# Altium footprint library Transformers.PcbLib: 93 footprints (part 6 of 7)
Each footprint in its own frame and in the unit in brackets; x right, y up, seen from the top. Pads: shape width x height; smd on the part's side, far side on the other; paste and mask are expansions set on the pad; w line width, h text height; cw(c..) or ccw(c..) is an arc to the next point about the centre after c.
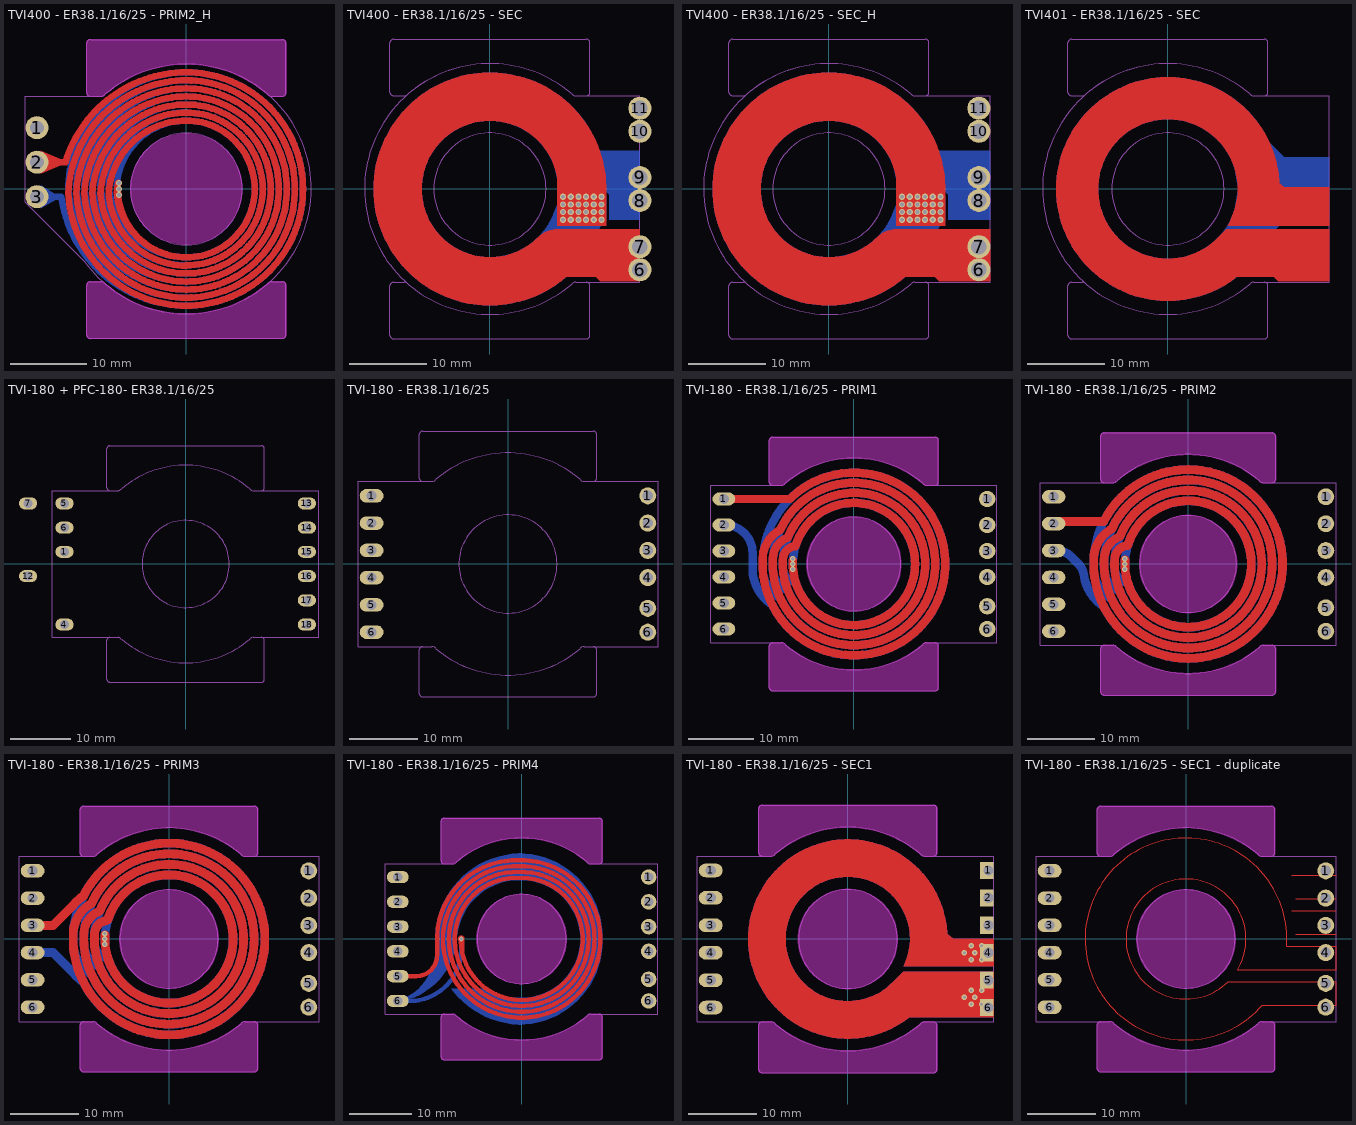
[diagram p5: the footprints below, top view; thin cyan lines are the x and y axes]

## TVI400 - ER38.1/16/25 - PRIM2_H [mm]
pads (3):
  round 3 hole 1.8: 1(-19.5,8) 2(-19.5,3.5) 3(-19.5,-1)
via -8.8,0 diameter 0.8 hole 0.5
via -8.8,-0.8 diameter 0.8 hole 0.5
via -8.8,0.8 diameter 0.8 hole 0.5
Top Layer:
  region: -19,5 -15.5,3.5 -19,2
  lines w0.85: -19.5,3.5 -15.789,3.5 -15.769,3.52 cw(c0,-1.25) 0,15.225 ; -10.152,-0.503 ccw(c0,0.175) 0,-10 cw(c0,0.175) -10.153,-0.494 ; -10.148,-0.507 cw(c0,-1.25) 0,8.925 ; -10.147,-0.497 cw(c0,-1.25) 0,8.925 ; -9.085,-0.401 cw(c0,-1.25) -8.892,0.798 ; -9.075,-0.498 ccw(c0,0.175) 0,-8.925 ; -8.911,-0.495 ccw(c0,0) 0,-8.925 ; 0,-15.225 ccw(c0,0) 15.225,0 ; 0,-15.225 cw(c0,0.2) -15.409,-0.496 ccw(c0,0.2) 0,-15.225 ; 0,-15.225 ccw(c0,0) 15.225,0 ; 0,-14.175 ccw(c0,0) 14.175,0 ; 0,-14.175 cw(c0,0.2) -14.358,-0.505 ccw(c0,0.2) 0,-14.175 ; 0,-14.175 ccw(c0,0) 14.175,0 ; 0,-13.125 ccw(c0,0) 13.125,0 ; 0,-13.125 cw(c0,0.2) -13.306,-0.503 ccw(c0,0.2) 0,-13.125 ; 0,-13.125 ccw(c0,0) 13.125,0 ; 0,-12.075 ccw(c0,0) 12.075,0 ; 0,-12.075 cw(c0,0.2) -12.255,-0.5 ccw(c0,0.2) 0,-12.075 ; 0,-12.075 ccw(c0,0) 12.075,0 ; 0,-11.025 ccw(c0,0) 11.025,0 ; 0,-11.025 cw(c0,0.2) -11.203,-0.497 ccw(c0,0.2) 0,-11.025 ; 0,-11.025 ccw(c0,0) 11.025,0 ; 0,-8.925 ccw(c0,0) 8.925,0 ; 0,-8.925 ccw(c0,0) 8.925,0 ; 0,8.925 cw(c0,0) 8.925,0 ; 0,8.925 cw(c0,0) 8.925,0 ; 0,9.975 cw(c0,0) 9.975,0 ; 0,9.975 ccw(c0,-1.25) -11.2,-0.503 cw(c0,-1.25) 0,9.975 ; 0,9.975 cw(c0,0) 9.975,0 ; 0,11.025 cw(c0,0) 11.025,0 ; 0,11.025 ccw(c0,-1.25) -12.252,-0.5 cw(c0,-1.25) 0,11.025 ; 0,11.025 cw(c0,0) 11.025,0 ; 0,12.075 cw(c0,0) 12.075,0 ; 0,12.075 ccw(c0,-1.25) -13.304,-0.497 cw(c0,-1.25) 0,12.075 ; 0,12.075 cw(c0,0) 12.075,0 ; 0,13.125 cw(c0,0) 13.125,0 ; 0,13.125 ccw(c0,-1.25) -14.355,-0.494 cw(c0,-1.25) 0,13.125 ; 0,13.125 cw(c0,0) 13.125,0 ; 0,14.175 cw(c0,0) 14.175,0 ; 0,14.175 ccw(c0,-1.25) -15.407,-0.505 cw(c0,-1.25) 0,14.175 ; 0,14.175 cw(c0,0) 14.175,0 ; 0,15.225 cw(c0,0) 15.225,0 ; 0,15.225 cw(c0,0) 15.225,0 ; 9.975,0 cw(c0,0) 0,-9.975 ccw(c0,0) 9.975,0
Bottom Layer:
  region: -19,0.5 -16.473,-1.059 -19,-2.5
  region: -9.3,0.4
  lines w0.85: -19.5,-1 -16.32,-1 ; -16.32,-1.001 ccw(c0,1.25) 0,-15.225 ccw(c0,0) 15.225,0 ccw(c0,0) 0,15.225 ccw(c0,-0.2) -15.409,0.496 ; -15.407,0.505 ccw(c0,1.25) 0,-14.175 ccw(c0,0) 14.175,0 ccw(c0,0) 0,14.175 ccw(c0,-0.2) -14.358,0.505 ; -14.355,0.494 ccw(c0,1.25) 0,-13.125 ccw(c0,0) 13.125,0 ccw(c0,0) 0,13.125 ccw(c0,-0.2) -13.306,0.503 ; -13.304,0.497 ccw(c0,1.25) 0,-12.075 ccw(c0,0) 12.075,0 ccw(c0,0) 0,12.075 ccw(c0,-0.2) -12.255,0.5 ; -12.252,0.5 ccw(c0,1.25) 0,-11.025 ccw(c0,0) 11.025,0 ccw(c0,0) 0,11.025 ccw(c0,-0.2) -11.203,0.497 ; -11.2,0.503 ccw(c0,1.25) 0,-9.975 ccw(c0,0) 9.975,0 ccw(c0,0) 0,9.975 ; -10.152,0.503 cw(c0,-0.175) 0,10 ; -10.147,0.497 ccw(c0,1.25) 0,-8.925 ccw(c0,0) 8.925,0 ccw(c0,0) 0,8.925 ccw(c0,-0.175) -9.075,0.498 ; -9.085,0.401 ccw(c0,1.25) -8.892,-0.798 ; -19,3.5 ccw(c-18.941,3.5) -18.941,3.441 cw(c-18.941,3.5) -19,3.5
Keep-Out Layer:
  drawing of 3 lines, arcs and shapes, not listed
Mechanical 2:
  circle w0.15: c0,0 r7.3
  lines w0.15: -0.251,-16.298 ccw(c0,0) 10.561,-12.416 ccw(c0,0) -0.251,16.298 ; 0.251,-16.298 cw(c0,0) -13.264,-9.474 -19.5,-3.238 -21,-1.738 -21,1 -21,12.103 -12.501,12.103 -11.15,12.103 ccw(c-11.15,12.771) -10.679,12.299 -10.562,12.416 cw(c0,0) 0.251,16.298
Top Assembly:
  circle w0.15: c0,0 r7.3
  lines w0.15: -0.251,16.298 cw(c0,0) 10.561,12.416 10.678,12.299 ccw(c11.15,12.771) 11.15,12.103 12.5,12.103 ccw(c12.5,12.603) 13,12.603 13,19 ccw(c12.5,19) 12.5,19.5 -12.5,19.5 ccw(c-12.5,19) -13,19 -13,12.603 ccw(c-12.5,12.603) -12.5,12.103 -11.15,12.103 ccw(c-11.15,12.771) -10.679,12.299 -10.562,12.416 cw(c0,0) 0.251,16.298 ; -13,-19 ccw(c-12.5,-19) -12.5,-19.5 ; -13,-19 ccw(c-12.5,-19) -12.5,-19.5 ; -13,-19 -13,-12.603 ; -13,-19 -13,-12.603 ; -13,-12.603 cw(c-12.5,-12.603) -12.5,-12.103 ; -13,-12.603 cw(c-12.5,-12.603) -12.5,-12.103 ; -12.5,-19.5 12.5,-19.5 ; -12.5,-19.5 12.5,-19.5 ; -12.5,-12.103 -11.15,-12.103 ; -12.5,-12.103 -11.15,-12.103 ; -11.15,-12.103 cw(c-11.15,-12.771) -10.679,-12.299 ; -11.15,-12.103 cw(c-11.15,-12.771) -10.679,-12.299 ; -10.679,-12.299 -10.562,-12.416 ; -10.679,-12.299 -10.562,-12.416 ; -10.561,-12.416 ccw(c0,0) 0.251,-16.298 cw(c0,0) -10.561,-12.416 ; 10.561,-12.416 cw(c0,0) -0.251,-16.298 ccw(c0,0) 10.561,-12.416 ; 10.561,-12.416 10.678,-12.299 ; 10.561,-12.416 10.678,-12.299 ; 10.678,-12.299 cw(c11.15,-12.771) 11.15,-12.103 ; 10.678,-12.299 cw(c11.15,-12.771) 11.15,-12.103 ; 11.15,-12.103 12.5,-12.103 ; 11.15,-12.103 12.5,-12.103 ; 12.5,-19.5 ccw(c12.5,-19) 13,-19 ; 12.5,-19.5 ccw(c12.5,-19) 13,-19 ; 12.5,-12.103 cw(c12.5,-12.603) 13,-12.603 ; 12.5,-12.103 cw(c12.5,-12.603) 13,-12.603 ; 13,-19 13,-12.603 ; 13,-19 13,-12.603
3D body "ER38.1-16-25.STEP": height 7.5, standoff -0.5, extent -12.7,-19.05 12.7,19.05

## TVI400 - ER38.1/16/25 - SEC [mm]
pads (6):
  round 3 hole 2: 6(19.5,-10.5) 7(19.5,-7.5) 8(19.5,-1.5) 9(19.5,1.5) 10(19.5,7.5) 11(19.5,10.5)
via 12.5,-4 diameter 0.8 hole 0.5
via 11.5,-4 diameter 0.8 hole 0.5
via 10.5,-4 diameter 0.8 hole 0.5
via 13.5,-3 diameter 0.8 hole 0.5
via 12.5,-3 diameter 0.8 hole 0.5
via 11.5,-3 diameter 0.8 hole 0.5
via 10.5,-3 diameter 0.8 hole 0.5
via 9.5,-3 diameter 0.8 hole 0.5
via 13.5,-2 diameter 0.8 hole 0.5
via 12.5,-2 diameter 0.8 hole 0.5
via 11.5,-2 diameter 0.8 hole 0.5
via 10.5,-2 diameter 0.8 hole 0.5
via 9.5,-2 diameter 0.8 hole 0.5
via 12.5,-1 diameter 0.8 hole 0.5
via 11.5,-1 diameter 0.8 hole 0.5
via 10.5,-1 diameter 0.8 hole 0.5
via 9.5,-1 diameter 0.8 hole 0.5
via 13.5,-1 diameter 0.8 hole 0.5
via 9.5,-4 diameter 0.8 hole 0.5
via 13.5,-4 diameter 0.8 hole 0.5
via 14.5,-4 diameter 0.8 hole 0.5
via 14.5,-1 diameter 0.8 hole 0.5
via 14.5,-2 diameter 0.8 hole 0.5
via 14.5,-3 diameter 0.8 hole 0.5
Top Layer:
  region: 6.107,-12 9.25,-12 9.825,-11.425 13.775,-11.425 14.35,-12 19.5,-12 19.5,-5.25 8.413,-5.25 3.885,-9.778
  region: 15.15,0.012 15.15,-4.75 8.75,-4.75 8.75,2.45 11.504,3.001
  lines w6.3: 8.546,-8.424 cw(c0,0) 0,-12 cw(c0,0) -12,0 cw(c0,0) 0,12 cw(c0,0) 11.903,-1.52
  text "1" at 14.5,7.5 h1.52
Bottom Layer:
  region: 9,0 14.75,0 15.5,-0.75 15.5,-4 19.5,-4 19.5,5 10,5 8.75,3.75 8.25,3.75 8.75,1.25 8.75,0
  region: 8.75,-0.275 14.525,-0.275 15.15,-0.9 15.15,-4.125 13.775,-5.5 8.75,-5.5 8.75,-2.5
  lines w6.3: 10.924,4.966 ccw(c0,0) 0,12 ccw(c0,0) -12,0 ccw(c0,0) 0,-12 ccw(c0,0) 11.398,-3.754
  text "2" at 15.5,7.5 h1.52
Mechanical 2:
  circle w0.15: c0,0 r7.3
  lines w0.15: -0.251,-16.298 ccw(c0,0) 10.562,-12.415 10.679,-12.299 cw(c11.15,-12.771) 11.15,-12.103 12.501,-12.103 19.5,-12.103 ; -0.251,16.298 cw(c0,0) 10.562,12.415 10.679,12.299 ccw(c11.15,12.771) 11.15,12.103 12.501,12.103 19.5,12.103 19.5,-0.5 19.5,-12.103 ; 0.251,-16.298 cw(c0,0) -10.561,-12.416 cw(c0,0) 0.251,16.298 ; 19.5,-3 19.5,-12.103
Top Assembly:
  circle w0.15: c0,0 r7.3
  lines w0.15: -0.251,16.298 cw(c0,0) 10.561,12.416 10.678,12.299 ccw(c11.15,12.771) 11.15,12.103 12.5,12.103 ccw(c12.5,12.603) 13,12.603 13,19 ccw(c12.5,19) 12.5,19.5 -12.5,19.5 ccw(c-12.5,19) -13,19 -13,12.603 ccw(c-12.5,12.603) -12.5,12.103 -11.15,12.103 ccw(c-11.15,12.771) -10.679,12.299 -10.562,12.416 cw(c0,0) 0.251,16.298 ; 11.15,-12.103 ccw(c11.15,-12.771) 10.678,-12.299 ; -13,-19 ccw(c-12.5,-19) -12.5,-19.5 ; -13,-19 ccw(c-12.5,-19) -12.5,-19.5 ; -13,-19 -13,-12.603 ; -13,-19 -13,-12.603 ; -13,-12.603 cw(c-12.5,-12.603) -12.5,-12.103 ; -13,-12.603 cw(c-12.5,-12.603) -12.5,-12.103 ; -12.5,-19.5 12.5,-19.5 ; -12.5,-19.5 12.5,-19.5 ; -12.5,-12.103 -11.15,-12.103 ; -12.5,-12.103 -11.15,-12.103 ; -11.15,-12.103 cw(c-11.15,-12.771) -10.679,-12.299 ; -11.15,-12.103 cw(c-11.15,-12.771) -10.679,-12.299 ; -10.679,-12.299 -10.562,-12.416 ; -10.679,-12.299 -10.562,-12.416 ; -10.561,-12.416 ccw(c0,0) 0.251,-16.298 cw(c0,0) -10.561,-12.416 ; 10.561,-12.416 cw(c0,0) -0.251,-16.298 ccw(c0,0) 10.561,-12.416 ; 10.561,-12.416 10.678,-12.299 ; 10.561,-12.416 10.678,-12.299 ; 10.561,-12.416 10.678,-12.299 ; 10.678,-12.299 cw(c11.15,-12.771) 11.15,-12.103 ; 10.678,-12.299 cw(c11.15,-12.771) 11.15,-12.103 ; 11.15,-12.103 12.5,-12.103 ; 11.15,-12.103 12.5,-12.103 ; 12.5,-19.5 ccw(c12.5,-19) 13,-19 ; 12.5,-19.5 ccw(c12.5,-19) 13,-19 ; 12.5,-12.103 cw(c12.5,-12.603) 13,-12.603 ; 12.5,-12.103 cw(c12.5,-12.603) 13,-12.603 ; 13,-19 13,-12.603 ; 13,-19 13,-12.603
3D body "ER38.1-16-25.STEP": height 7.5, standoff -0.5, extent -12.7,-19.05 12.7,19.05

## TVI400 - ER38.1/16/25 - SEC_H [mm]
pads (6):
  round 3 hole 2: 6(19.5,-10.5) 7(19.5,-7.5) 8(19.5,-1.5) 9(19.5,1.5) 10(19.5,7.5) 11(19.5,10.5)
via 14.5,-3 diameter 0.8 hole 0.5
via 14.5,-2 diameter 0.8 hole 0.5
via 14.5,-1 diameter 0.8 hole 0.5
via 14.5,-4 diameter 0.8 hole 0.5
via 13.5,-4 diameter 0.8 hole 0.5
via 9.5,-4 diameter 0.8 hole 0.5
via 13.5,-1 diameter 0.8 hole 0.5
via 9.5,-1 diameter 0.8 hole 0.5
via 10.5,-1 diameter 0.8 hole 0.5
via 11.5,-1 diameter 0.8 hole 0.5
via 12.5,-1 diameter 0.8 hole 0.5
via 9.5,-2 diameter 0.8 hole 0.5
via 10.5,-2 diameter 0.8 hole 0.5
via 11.5,-2 diameter 0.8 hole 0.5
via 12.5,-2 diameter 0.8 hole 0.5
via 13.5,-2 diameter 0.8 hole 0.5
via 9.5,-3 diameter 0.8 hole 0.5
via 10.5,-3 diameter 0.8 hole 0.5
via 11.5,-3 diameter 0.8 hole 0.5
via 12.5,-3 diameter 0.8 hole 0.5
via 13.5,-3 diameter 0.8 hole 0.5
via 10.5,-4 diameter 0.8 hole 0.5
via 11.5,-4 diameter 0.8 hole 0.5
via 12.5,-4 diameter 0.8 hole 0.5
Top Layer:
  region: 15.15,0.012 15.15,-4.75 8.75,-4.75 8.75,2.45 11.504,3.001
  region: 6.107,-12 9.25,-12 9.825,-11.425 13.775,-11.425 14.35,-12 21,-12 21,-5.25 8.413,-5.25 3.885,-9.778
  lines w6.3: 8.546,-8.424 cw(c0,0) 0,-12 cw(c0,0) -12,0 cw(c0,0) 0,12 cw(c0,0) 11.903,-1.52
Bottom Layer:
  region: 8.75,-0.275 14.525,-0.275 15.15,-0.9 15.15,-4.125 13.775,-5.5 8.75,-5.5 8.75,-2.5
  region: 9,0 14.75,0 15.5,-0.75 15.5,-4 21,-4 21,5 10,5 8.75,3.75 8.25,3.75 8.75,1.25 8.75,0
  lines w6.3: 10.924,4.966 ccw(c0,0) 0,12 ccw(c0,0) -12,0 ccw(c0,0) 0,-12 ccw(c0,0) 11.398,-3.754
Mechanical 2:
  circle w0.15: c0,0 r7.3
  lines w0.15: -0.251,-16.298 ccw(c0,0) 10.562,-12.415 10.679,-12.299 cw(c11.15,-12.771) 11.15,-12.103 12.501,-12.103 21,-12.103 21,1 21,12.103 12.501,12.103 11.15,12.103 cw(c11.15,12.771) 10.679,12.299 10.562,12.416 ccw(c0,0) -0.251,16.298 ; 0.251,-16.298 cw(c0,0) -10.561,-12.416 cw(c0,0) 0.251,16.298
Top Assembly:
  circle w0.15: c0,0 r7.3
  lines w0.15: -0.251,16.298 cw(c0,0) 10.561,12.416 10.678,12.299 ccw(c11.15,12.771) 11.15,12.103 12.5,12.103 ccw(c12.5,12.603) 13,12.603 13,19 ccw(c12.5,19) 12.5,19.5 -12.5,19.5 ccw(c-12.5,19) -13,19 -13,12.603 ccw(c-12.5,12.603) -12.5,12.103 -11.15,12.103 ccw(c-11.15,12.771) -10.679,12.299 -10.562,12.416 cw(c0,0) 0.251,16.298 ; 11.15,-12.103 ccw(c11.15,-12.771) 10.678,-12.299 ; -13,-19 ccw(c-12.5,-19) -12.5,-19.5 ; -13,-19 ccw(c-12.5,-19) -12.5,-19.5 ; -13,-19 -13,-12.603 ; -13,-19 -13,-12.603 ; -13,-12.603 cw(c-12.5,-12.603) -12.5,-12.103 ; -13,-12.603 cw(c-12.5,-12.603) -12.5,-12.103 ; -12.5,-19.5 12.5,-19.5 ; -12.5,-19.5 12.5,-19.5 ; -12.5,-12.103 -11.15,-12.103 ; -12.5,-12.103 -11.15,-12.103 ; -11.15,-12.103 cw(c-11.15,-12.771) -10.679,-12.299 ; -11.15,-12.103 cw(c-11.15,-12.771) -10.679,-12.299 ; -10.679,-12.299 -10.562,-12.416 ; -10.679,-12.299 -10.562,-12.416 ; -10.561,-12.416 ccw(c0,0) 0.251,-16.298 cw(c0,0) -10.561,-12.416 ; 10.561,-12.416 cw(c0,0) -0.251,-16.298 ccw(c0,0) 10.561,-12.416 ; 10.561,-12.416 10.678,-12.299 ; 10.561,-12.416 10.678,-12.299 ; 10.561,-12.416 10.678,-12.299 ; 10.678,-12.299 cw(c11.15,-12.771) 11.15,-12.103 ; 10.678,-12.299 cw(c11.15,-12.771) 11.15,-12.103 ; 11.15,-12.103 12.5,-12.103 ; 11.15,-12.103 12.5,-12.103 ; 12.5,-19.5 ccw(c12.5,-19) 13,-19 ; 12.5,-19.5 ccw(c12.5,-19) 13,-19 ; 12.5,-12.103 cw(c12.5,-12.603) 13,-12.603 ; 12.5,-12.103 cw(c12.5,-12.603) 13,-12.603 ; 13,-19 13,-12.603 ; 13,-19 13,-12.603
3D body "ER38.1-16-25.STEP": height 7.5, standoff -0.5, extent -12.7,-19.05 12.7,19.05

## TVI401 - ER38.1/16/25 - SEC [mm]
Top Layer:
  region: 15.1,0.226 21,0.226 21,-4.748 15.1,-4.748 7.808,-4.748 8.017,-4.333 8.384,-3.481 8.679,-2.601 8.9,-1.7 9.046,-0.784 9.117,0.142 9.111,1.069 9.028,1.994 8.958,2.452 11.712,3.003
  region: 5.532,-11.425 9.825,-11.425 13.775,-11.425 14.35,-12 21,-12 21,-5.25 7.55,-5.25 3.454,-9.346
  lines w5.5: 8.404,-8.284 cw(c0,0) 0,-11.8 cw(c0,0) -11.8,0 cw(c0,0) 0,11.8 cw(c0,0) 11.705,-1.495
Bottom Layer:
  region: 9.1,-0.275 15.075,-0.275 21,-0.275 21,-4.125 15.15,-4.125 12.075,-7.2 9.335,-7.2 8.7,-2.6
  region: 9.1,0.275 15.075,0.275 21,0.275 21,4.125 15.15,4.125 12.075,7.2 9.335,7.2 8.7,2.6
  lines w5.5: 11.208,-3.692 cw(c0,0) 0,-11.8 cw(c0,0) -11.8,0 cw(c0,0) 0,11.8 cw(c0,0) 11.384,3.105
Mechanical 2:
  circle w0.15: c0,0 r7.3
  lines w0.15: -0.251,-16.298 ccw(c0,0) 10.562,-12.415 10.679,-12.299 cw(c11.15,-12.771) 11.15,-12.103 12.501,-12.103 21,-12.103 21,1 21,12.103 12.501,12.103 11.15,12.103 cw(c11.15,12.771) 10.679,12.299 10.562,12.416 ccw(c0,0) -0.251,16.298 ; 0.251,-16.298 cw(c0,0) -10.561,-12.416 cw(c0,0) 0.251,16.298
Top Assembly:
  circle w0.15: c0,0 r7.3
  lines w0.15: -0.251,16.298 cw(c0,0) 10.561,12.416 10.678,12.299 ccw(c11.15,12.771) 11.15,12.103 12.5,12.103 ccw(c12.5,12.603) 13,12.603 13,19 ccw(c12.5,19) 12.5,19.5 -12.5,19.5 ccw(c-12.5,19) -13,19 -13,12.603 ccw(c-12.5,12.603) -12.5,12.103 -11.15,12.103 ccw(c-11.15,12.771) -10.679,12.299 -10.562,12.416 cw(c0,0) 0.251,16.298 ; 11.15,-12.103 ccw(c11.15,-12.771) 10.678,-12.299 ; -13,-19 ccw(c-12.5,-19) -12.5,-19.5 ; -13,-19 ccw(c-12.5,-19) -12.5,-19.5 ; -13,-19 -13,-12.603 ; -13,-19 -13,-12.603 ; -13,-12.603 cw(c-12.5,-12.603) -12.5,-12.103 ; -13,-12.603 cw(c-12.5,-12.603) -12.5,-12.103 ; -12.5,-19.5 12.5,-19.5 ; -12.5,-19.5 12.5,-19.5 ; -12.5,-12.103 -11.15,-12.103 ; -12.5,-12.103 -11.15,-12.103 ; -11.15,-12.103 cw(c-11.15,-12.771) -10.679,-12.299 ; -11.15,-12.103 cw(c-11.15,-12.771) -10.679,-12.299 ; -10.679,-12.299 -10.562,-12.416 ; -10.679,-12.299 -10.562,-12.416 ; -10.561,-12.416 ccw(c0,0) 0.251,-16.298 cw(c0,0) -10.561,-12.416 ; 10.561,-12.416 cw(c0,0) -0.251,-16.298 ccw(c0,0) 10.561,-12.416 ; 10.561,-12.416 10.678,-12.299 ; 10.561,-12.416 10.678,-12.299 ; 10.561,-12.416 10.678,-12.299 ; 10.678,-12.299 cw(c11.15,-12.771) 11.15,-12.103 ; 10.678,-12.299 cw(c11.15,-12.771) 11.15,-12.103 ; 11.15,-12.103 12.5,-12.103 ; 11.15,-12.103 12.5,-12.103 ; 12.5,-19.5 ccw(c12.5,-19) 13,-19 ; 12.5,-19.5 ccw(c12.5,-19) 13,-19 ; 12.5,-12.103 cw(c12.5,-12.603) 13,-12.603 ; 12.5,-12.103 cw(c12.5,-12.603) 13,-12.603 ; 13,-19 13,-12.603 ; 13,-19 13,-12.603
3D body "ER38.1-16-25.STEP": height 7.5, standoff -0.5, extent -12.7,-19.05 12.7,19.05

## TVI-180 + PFC-180- ER38.1/16/25 [mm]
pads (12):
  oval 3x2 hole 1.5: 1(-20,2) 4(-20,-10) 5(-20,10) 6(-20,6) 7(-26,10) 12(-26,-2) 13(20,10) 14(20,6) 15(20,2) 16(20,-2) 17(20,-6) 18(20,-10)
Mechanical 2:
  circle w0.15: c0,0 r7.2
  lines w0.15: -22,-0.5 -22,12.103 -12.501,12.103 -11.15,12.103 ccw(c-11.15,12.771) -10.679,12.299 -10.562,12.416 cw(c0,0) 0.251,16.298 ; -22,0.5 -22,-12.103 -12.501,-12.103 -11.15,-12.103 cw(c-11.15,-12.771) -10.679,-12.299 -10.562,-12.416 ccw(c0,0) 0.251,-16.298 ; -0.251,-16.298 ccw(c0,0) 10.562,-12.415 10.679,-12.299 ; -0.251,16.298 cw(c0,0) 10.562,12.415 10.679,12.299 ; 22,-0.5 22,12.103 12.501,12.103 ; 22,0.5 22,-12.103 12.501,-12.103 ; 10.679,-12.299 cw(c11.15,-12.771) 11.15,-12.103 ; 10.679,-12.299 cw(c11.15,-12.771) 11.15,-12.103 ; 10.679,12.299 ccw(c11.15,12.771) 11.15,12.103 ; 10.679,12.299 ccw(c11.15,12.771) 11.15,12.103 ; 11.15,-12.103 12.501,-12.103 ; 11.15,-12.103 12.501,-12.103 ; 11.15,12.103 12.501,12.103 ; 11.15,12.103 12.501,12.103
Top Assembly:
  circle w0.15: c0,0 r7.2
  lines w0.15: -0.251,16.298 cw(c0,0) 10.561,12.416 10.678,12.299 ccw(c11.15,12.771) 11.15,12.103 12.5,12.103 ccw(c12.5,12.603) 13,12.603 13,19 ccw(c12.5,19) 12.5,19.5 -12.5,19.5 ccw(c-12.5,19) -13,19 -13,12.603 ccw(c-12.5,12.603) -12.5,12.103 -11.15,12.103 ccw(c-11.15,12.771) -10.679,12.299 -10.562,12.416 cw(c0,0) 0.251,16.298 ; -13,-19 ccw(c-12.5,-19) -12.5,-19.5 ; -13,-19 ccw(c-12.5,-19) -12.5,-19.5 ; -13,-19 -13,-12.603 ; -13,-19 -13,-12.603 ; -13,-12.603 cw(c-12.5,-12.603) -12.5,-12.103 ; -13,-12.603 cw(c-12.5,-12.603) -12.5,-12.103 ; -12.5,-19.5 12.5,-19.5 ; -12.5,-19.5 12.5,-19.5 ; -12.5,-12.103 -11.15,-12.103 ; -12.5,-12.103 -11.15,-12.103 ; -11.15,-12.103 cw(c-11.15,-12.771) -10.679,-12.299 ; -11.15,-12.103 cw(c-11.15,-12.771) -10.679,-12.299 ; -10.679,-12.299 -10.562,-12.416 ; -10.679,-12.299 -10.562,-12.416 ; -10.561,-12.416 ccw(c0,0) 0.251,-16.298 cw(c0,0) -10.561,-12.416 ; 10.561,-12.416 cw(c0,0) -0.251,-16.298 ccw(c0,0) 10.561,-12.416 ; 10.561,-12.416 10.678,-12.299 ; 10.561,-12.416 10.678,-12.299 ; 10.678,-12.299 cw(c11.15,-12.771) 11.15,-12.103 ; 10.678,-12.299 cw(c11.15,-12.771) 11.15,-12.103 ; 11.15,-12.103 12.5,-12.103 ; 11.15,-12.103 12.5,-12.103 ; 12.5,-19.5 ccw(c12.5,-19) 13,-19 ; 12.5,-19.5 ccw(c12.5,-19) 13,-19 ; 12.5,-12.103 cw(c12.5,-12.603) 13,-12.603 ; 12.5,-12.103 cw(c12.5,-12.603) 13,-12.603 ; 13,-19 13,-12.603 ; 13,-19 13,-12.603
3D body "ER38.1-16-25.STEP": height -17, standoff -25, extent -12.7,-19.05 12.7,19.05
3D body "ER38.1-16-25.STEP": height -25, standoff -33, extent -12.7,-19.05 12.7,19.05
3D body "ER38.1-16-25.STEP": height -9, standoff -17, extent -12.7,-19.05 12.7,19.05
3D body "ER38.1-16-25.STEP": height -1, standoff -9, extent -12.7,-19.05 12.7,19.05
3D body: height 1, standoff 0, extent -13,-20 13,0
3D body: height 1, standoff 0, extent -13,0 13,20
3D body: height 32, standoff 0.25, extent -7,19 7,20
3D body: height 34, standoff 32, extent 7,20 13,23.5
3D body: height 34, standoff 32, extent 7,23.5 13,26.5
3D body: height 34, standoff 32, extent -13,23.5 -7,26.5
3D body: height 34, standoff 32, extent -13,20 -7,23.5
3D body: height 2, standoff 0.25, extent -13,20 -7,23.5
3D body: height 2, standoff 0.25, extent -13,23.5 -7,26.5
3D body: height 2, standoff 0.25, extent 7,23.5 13,26.5
3D body: height 2, standoff 0.25, extent 7,20 13,23.5
3D body: height 34, standoff 32, extent -13,0 13,20
3D body: height 34, standoff 32, extent -13,-20 13,0
3D body: height 2, standoff 0.25, extent -13,-23.5 -7,-20
3D body: height 2, standoff 0.25, extent -13,-26.5 -7,-23.5
3D body: height 2, standoff 0.25, extent 7,-26.5 13,-23.5
3D body: height 2, standoff 0.25, extent 7,-23.5 13,-20
3D body: height 34, standoff 32, extent 7,-23.5 13,-20
3D body: height 34, standoff 32, extent 7,-26.5 13,-23.5
3D body: height 34, standoff 32, extent -13,-26.5 -7,-23.5
3D body: height 34, standoff 32, extent -13,-23.5 -7,-20
3D body: height 32, standoff 0.25, extent -7,-20 7,-19
3D body: height 13, standoff 3, extent -21.5,-16.3 22,0.1
3D body: height 13, standoff 3, extent -21.5,-0.1 22,16.3
3D body: height 29, standoff 19, extent -27,-16.3 0.002,0.1
3D body: height 29, standoff 19, extent -27,-0.1 0.002,16.3
3D body: height 29, standoff 19, extent 0,-16.262 16.597,16.262
